# Altium footprint library PassiveComponents.PcbLib: 111 footprints (part 2 of 7)
Each footprint in its own frame and in the unit in brackets; x right, y up, seen from the top. Pads: shape width x height; smd on the part's side, far side on the other; paste and mask are expansions set on the pad; w line width, h text height; cw(c..) or ccw(c..) is an arc to the next point about the centre after c.
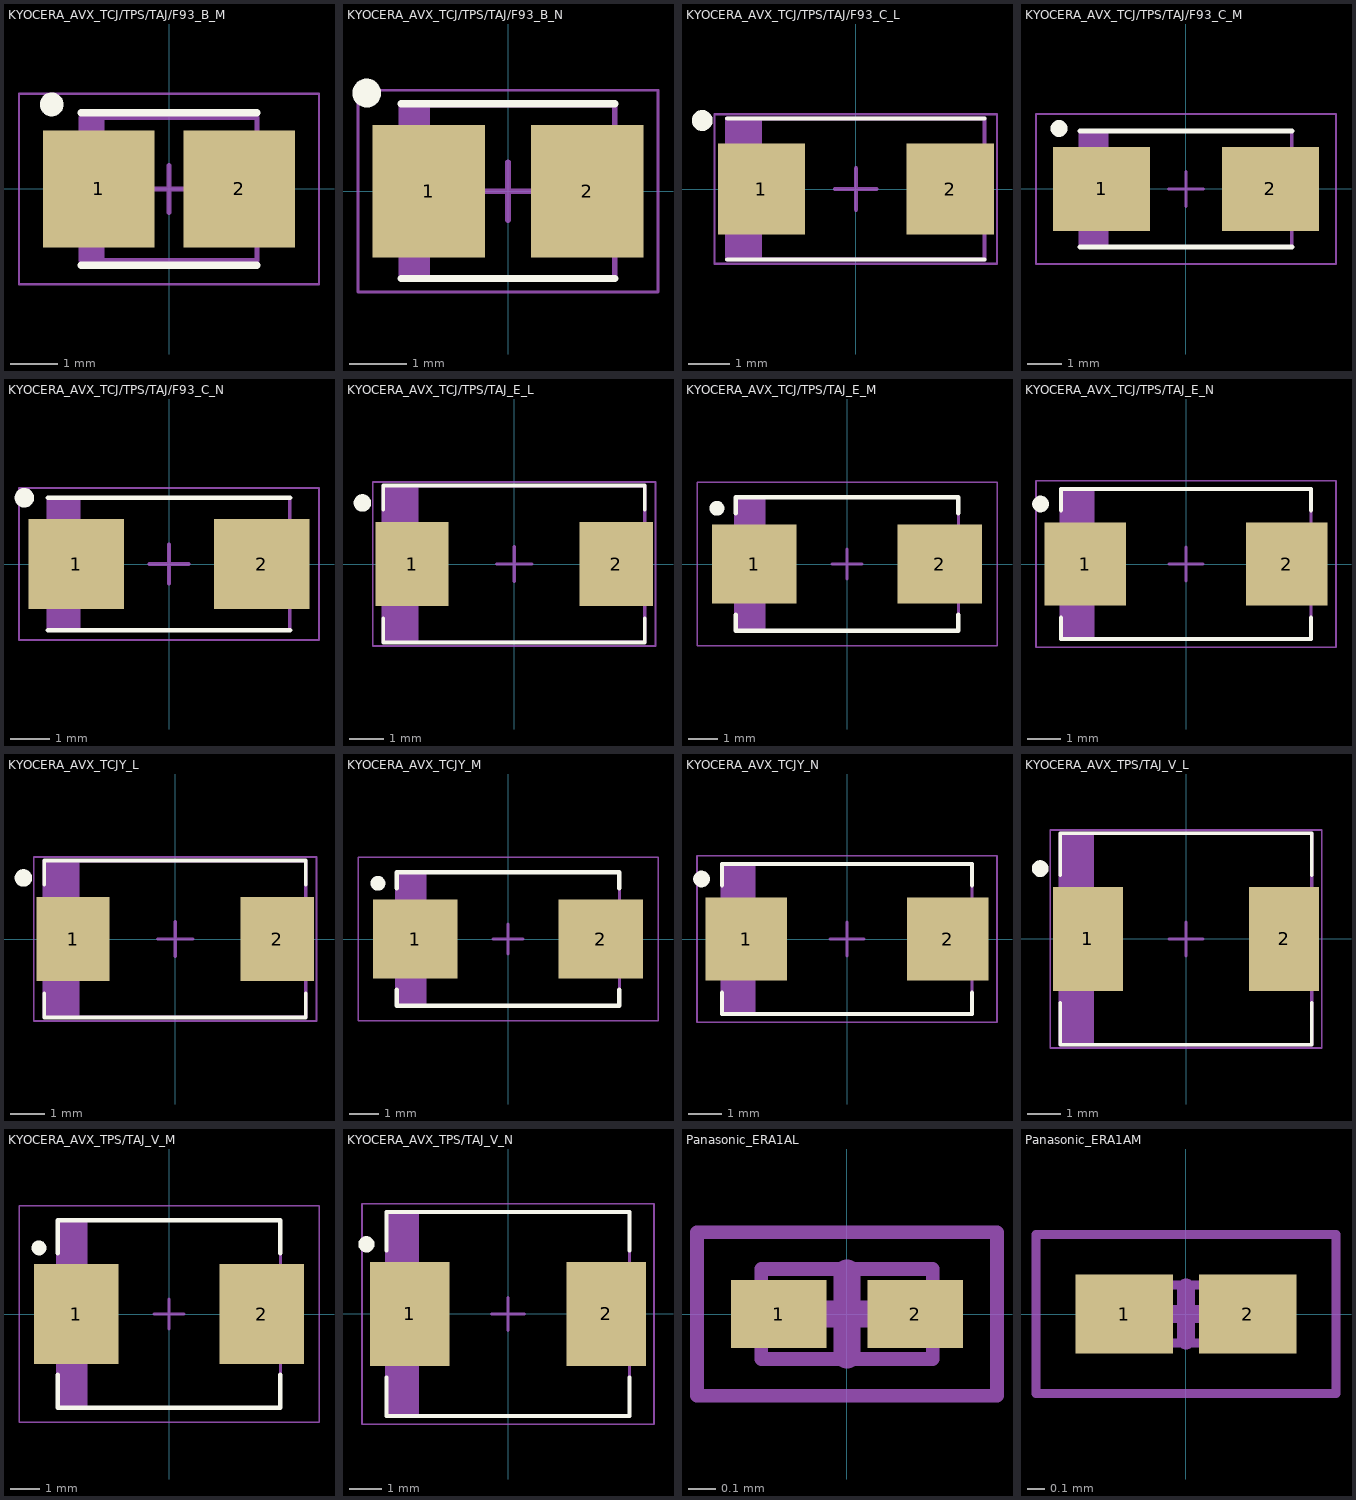
[diagram p1: the footprints below, top view; thin cyan lines are the x and y axes]

## KYOCERA_AVX_TCJ/TPS/TAJ/F93_B_M [mm] "Molded Capacitor, 2-Leads, Body 3.50x2.85mm, IPC Low Density"
height 2.1
pads (2):
  rect 2.35x2.45 smd mask+0.05: 1(-1.475,0) 2(1.475,0)
Top Overlay:
  circle w0.25: c-2.464,1.775 r0.125
  lines w0.152: -1.85,-1.601 1.85,-1.601 ; -1.85,1.601 1.85,1.601
Top Assembly:
  rectangle: -1.85,-1.5 -1.352,1.5
  lines w0.1: -1.85,-1.5 1.85,-1.5 1.85,1.5 -1.85,1.5 -1.85,-1.5
  text "'.Designator'" at -1.209,-0.113 h0.5
Top Courtyard:
  lines w0.05: -3.15,-2 3.15,-2 3.15,2 -3.15,2 -3.15,-2
  lines w0.1: -0.5,0 0.5,0 ; 0,-0.5 0,0.5
3D body "CAPMP3528X21M.step": height 2.1, standoff 0, extent -2.07,-1.5 2.07,1.5

## KYOCERA_AVX_TCJ/TPS/TAJ/F93_B_N [mm] "Molded Capacitor, 2-Leads, Body 3.50x2.85mm, IPC Medium Density"
height 2.1
pads (2):
  rect 1.95x2.3 smd mask+0.05: 1(-1.375,0) 2(1.375,0)
Top Overlay:
  circle w0.25: c-2.449,1.7 r0.125
  lines w0.127: -1.85,-1.514 1.85,-1.514 ; -1.85,1.514 1.85,1.514
Top Assembly:
  rectangle: -1.85,-1.5 -1.352,1.5
  lines w0.1: -1.85,-1.5 1.85,-1.5 1.85,1.5 -1.85,1.5 -1.85,-1.5
  text "'.Designator'" at -1.209,-0.113 h0.5
Top Courtyard:
  lines w0.05: -2.6,-1.75 2.6,-1.75 2.6,1.75 -2.6,1.75 -2.6,-1.75
  lines w0.1: -0.5,0 0.5,0 ; 0,-0.5 0,0.5
3D body "CAPMP3528X21N.step": height 2.1, standoff 0, extent -2.07,-1.5 2.07,1.5

## KYOCERA_AVX_TCJ/TPS/TAJ/F93_C_L [mm] "Molded Capacitor, 2-Leads, Body 6.00x3.25mm, IPC High Density"
height 2.8
pads (2):
  rect 2.1x2.2 smd mask+0.05: 1(-2.275,0) 2(2.275,0)
Top Overlay:
  circle w0.25: c-3.701,1.65 r0.125
  lines w0.102: -3.1,-1.7 3.1,-1.7 ; -3.1,1.7 3.1,1.7
Top Assembly:
  rectangle: -3.1,-1.7 -2.266,1.7
  lines w0.1: -3.1,-1.7 -3.1,1.7 3.1,1.7 3.1,-1.7 -3.1,-1.7
  text "'.Designator'" at -1.209,-0.113 h0.5
Top Courtyard:
  lines w0.05: -3.4,-1.8 -3.4,1.8 3.4,1.8 3.4,-1.8 -3.4,-1.8
  lines w0.1: -0.5,0 0.5,0 ; 0,-0.5 0,0.5
3D body "CAPMP6032X28L.step": height 2.8, standoff 0, extent -3.32,-1.7 3.32,1.7

## KYOCERA_AVX_TCJ/TPS/TAJ/F93_C_M [mm] "Molded Capacitor, 2-Leads, Body 6.00x3.25mm, IPC Low Density"
height 2.8
pads (2):
  rect 2.85x2.45 smd mask+0.05: 1(-2.475,0) 2(2.475,0)
Top Overlay:
  circle w0.25: c-3.724,1.775 r0.125
  lines w0.152: -3.1,-1.7 3.1,-1.7 ; -3.1,1.7 3.1,1.7
Top Assembly:
  rectangle: -3.1,-1.7 -2.266,1.7
  lines w0.1: -3.1,-1.7 3.1,-1.7 3.1,1.7 -3.1,1.7 -3.1,-1.7
  text "'.Designator'" at -1.209,-0.113 h0.5
Top Courtyard:
  lines w0.05: -4.4,-2.2 4.4,-2.2 4.4,2.2 -4.4,2.2 -4.4,-2.2
  lines w0.1: -0.5,0 0.5,0 ; 0,-0.5 0,0.5
3D body "CAPMP6032X28M.step": height 2.8, standoff 0, extent -3.32,-1.7 3.32,1.7

## KYOCERA_AVX_TCJ/TPS/TAJ/F93_C_N [mm] "Molded Capacitor, 2-Leads, Body 6.00x3.25mm, IPC Medium Density"
height 2.8
pads (2):
  rect 2.45x2.3 smd mask+0.05: 1(-2.375,0) 2(2.375,0)
Top Overlay:
  circle w0.25: c-3.713,1.7 r0.125
  lines w0.127: -3.1,-1.7 3.1,-1.7 ; -3.1,1.7 3.1,1.7
Top Assembly:
  rectangle: -3.1,-1.7 -2.266,1.7
  lines w0.1: -3.1,-1.7 3.1,-1.7 3.1,1.7 -3.1,1.7 -3.1,-1.7
  text "'.Designator'" at -1.209,-0.113 h0.5
Top Courtyard:
  lines w0.05: -3.85,-1.95 3.85,-1.95 3.85,1.95 -3.85,1.95 -3.85,-1.95
  lines w0.1: -0.5,0 0.5,0 ; 0,-0.5 0,0.5
3D body "CAPMP6032X28N.step": height 2.8, standoff 0, extent -3.32,-1.7 3.32,1.7

## KYOCERA_AVX_TCJ/TPS/TAJ_E_L [mm] "Molded Capacitor, 2-Leads, Body 7.30x4.35mm, IPC High Density"
height 4.3
pads (2):
  rect 2.1x2.4 smd mask+0.05: 1(-2.925,0) 2(2.925,0)
Top Overlay:
  circle w0.25: c-4.351,1.75 r0.125
  lines w0.102: -3.75,-1.551 -3.75,-2.25 3.75,-2.25 3.75,-1.551 ; -3.75,1.551 -3.75,2.25 3.75,2.25 3.75,1.551
Top Assembly:
  rectangle: -3.75,-2.25 -2.741,2.25
  lines w0.1: -3.75,-2.25 -3.75,2.25 3.75,2.25 3.75,-2.25 -3.75,-2.25
  text "'.Designator'" at -1.209,-0.113 h0.5
Top Courtyard:
  lines w0.05: -4.05,-2.35 -4.05,2.35 4.05,2.35 4.05,-2.35 -4.05,-2.35
  lines w0.1: -0.5,0 0.5,0 ; 0,-0.5 0,0.5
3D body "CAPMP7344X43L.step": height 4.3, standoff 0, extent -3.97,-2.25 3.97,2.25

## KYOCERA_AVX_TCJ/TPS/TAJ_E_M [mm] "Molded Capacitor, 2-Leads, Body 7.30x4.35mm, IPC Low Density"
height 4.3
pads (2):
  rect 2.85x2.65 smd mask+0.05: 1(-3.125,0) 2(3.125,0)
Top Overlay:
  circle w0.25: c-4.376,1.875 r0.125
  lines w0.152: -3.75,-1.701 -3.75,-2.25 3.75,-2.25 3.75,-1.701 ; -3.75,1.701 -3.75,2.25 3.75,2.25 3.75,1.701
Top Assembly:
  rectangle: -3.75,-2.25 -2.741,2.25
  lines w0.1: -3.75,-2.25 3.75,-2.25 3.75,2.25 -3.75,2.25 -3.75,-2.25
  text "'.Designator'" at -1.209,-0.113 h0.5
Top Courtyard:
  lines w0.05: -5.05,-2.75 5.05,-2.75 5.05,2.75 -5.05,2.75 -5.05,-2.75
  lines w0.1: -0.5,0 0.5,0 ; 0,-0.5 0,0.5
3D body "CAPMP7344X43M.step": height 4.3, standoff 0, extent -3.97,-2.25 3.97,2.25

## KYOCERA_AVX_TCJ/TPS/TAJ_E_N [mm] "Molded Capacitor, 2-Leads, Body 7.30x4.35mm, IPC Medium Density"
height 4.3
pads (2):
  rect 2.45x2.5 smd mask+0.05: 1(-3.025,0) 2(3.025,0)
Top Overlay:
  circle w0.25: c-4.363,1.8 r0.125
  lines w0.127: -3.75,-1.614 -3.75,-2.25 3.75,-2.25 3.75,-1.614 ; -3.75,1.614 -3.75,2.25 3.75,2.25 3.75,1.614
Top Assembly:
  rectangle: -3.75,-2.25 -2.741,2.25
  lines w0.1: -3.75,-2.25 3.75,-2.25 3.75,2.25 -3.75,2.25 -3.75,-2.25
  text "'.Designator'" at -1.209,-0.113 h0.5
Top Courtyard:
  lines w0.05: -4.5,-2.5 4.5,-2.5 4.5,2.5 -4.5,2.5 -4.5,-2.5
  lines w0.1: -0.5,0 0.5,0 ; 0,-0.5 0,0.5
3D body "CAPMP7344X43N.step": height 4.3, standoff 0, extent -3.97,-2.25 3.97,2.25

## KYOCERA_AVX_TCJY_L [mm] "Molded Capacitor, 2-Leads, Body 7.30x4.35mm, IPC High Density"
height 2.2
pads (2):
  rect 2.1x2.4 smd mask+0.05: 1(-2.925,0) 2(2.925,0)
Top Overlay:
  circle w0.25: c-4.351,1.75 r0.125
  lines w0.102: -3.75,-1.551 -3.75,-2.25 3.75,-2.25 3.75,-1.551 ; -3.75,1.551 -3.75,2.25 3.75,2.25 3.75,1.551
Top Assembly:
  rectangle: -3.75,-2.25 -2.741,2.25
  lines w0.1: -3.75,-2.25 3.75,-2.25 3.75,2.25 -3.75,2.25 -3.75,-2.25
  text "'.Designator'" at -1.209,-0.113 h0.5
Top Courtyard:
  lines w0.05: -4.05,-2.35 4.05,-2.35 4.05,2.35 -4.05,2.35 -4.05,-2.35
  lines w0.1: -0.5,0 0.5,0 ; 0,-0.5 0,0.5
3D body "CAPMP7344X22L.step": height 2.2, standoff 0, extent -3.97,-2.25 3.97,2.25

## KYOCERA_AVX_TCJY_M [mm] "Molded Capacitor, 2-Leads, Body 7.30x4.35mm, IPC Low Density"
height 2.2
pads (2):
  rect 2.85x2.65 smd mask+0.05: 1(-3.125,0) 2(3.125,0)
Top Overlay:
  circle w0.25: c-4.376,1.875 r0.125
  lines w0.152: -3.75,-1.701 -3.75,-2.25 3.75,-2.25 3.75,-1.701 ; -3.75,1.701 -3.75,2.25 3.75,2.25 3.75,1.701
Top Assembly:
  rectangle: -3.75,-2.25 -2.741,2.25
  lines w0.1: -3.75,-2.25 3.75,-2.25 3.75,2.25 -3.75,2.25 -3.75,-2.25
  text "'.Designator'" at -1.209,-0.113 h0.5
Top Courtyard:
  lines w0.05: -5.05,-2.75 5.05,-2.75 5.05,2.75 -5.05,2.75 -5.05,-2.75
  lines w0.1: -0.5,0 0.5,0 ; 0,-0.5 0,0.5
3D body "CAPMP7344X22M.step": height 2.2, standoff 0, extent -3.97,-2.25 3.97,2.25

## KYOCERA_AVX_TCJY_N [mm] "Molded Capacitor, 2-Leads, Body 7.30x4.35mm, IPC Medium Density"
height 2.2
pads (2):
  rect 2.45x2.5 smd mask+0.05: 1(-3.025,0) 2(3.025,0)
Top Overlay:
  circle w0.25: c-4.363,1.8 r0.125
  lines w0.127: -3.75,-1.614 -3.75,-2.25 3.75,-2.25 3.75,-1.614 ; -3.75,1.614 -3.75,2.25 3.75,2.25 3.75,1.614
Top Assembly:
  rectangle: -3.75,-2.25 -2.741,2.25
  lines w0.1: -3.75,-2.25 -3.75,2.25 3.75,2.25 3.75,-2.25 -3.75,-2.25
  text "'.Designator'" at -1.209,-0.113 h0.5
Top Courtyard:
  lines w0.05: -4.5,-2.5 -4.5,2.5 4.5,2.5 4.5,-2.5 -4.5,-2.5
  lines w0.1: -0.5,0 0.5,0 ; 0,-0.5 0,0.5
3D body "CAPMP7344X22N.step": height 2.2, standoff 0, extent -3.97,-2.25 3.97,2.25

## KYOCERA_AVX_TPS/TAJ_V_L [mm] "Molded Capacitor, 2-Leads, Body 7.30x6.15mm, IPC High Density"
height 3.75
pads (2):
  rect 2.1x3.1 smd mask+0.05: 1(-2.925,0) 2(2.925,0)
Top Overlay:
  circle w0.25: c-4.351,2.1 r0.125
  lines w0.102: -3.75,-1.901 -3.75,-3.15 3.75,-3.15 3.75,-1.901 ; -3.75,1.901 -3.75,3.15 3.75,3.15 3.75,1.901
Top Assembly:
  rectangle: -3.75,-3.15 -2.741,3.15
  lines w0.1: -3.75,-3.15 -3.75,3.15 3.75,3.15 3.75,-3.15 -3.75,-3.15
  text "'.Designator'" at -1.209,-0.113 h0.5
Top Courtyard:
  lines w0.05: -4.05,-3.25 -4.05,3.25 4.05,3.25 4.05,-3.25 -4.05,-3.25
  lines w0.1: -0.5,0 0.5,0 ; 0,-0.5 0,0.5
3D body "CAPMP7362X38L.step": height 3.75, standoff 0, extent -3.97,-3.15 3.97,3.15

## KYOCERA_AVX_TPS/TAJ_V_M [mm] "Molded Capacitor, 2-Leads, Body 7.30x6.15mm, IPC Low Density"
height 3.75
pads (2):
  rect 2.85x3.35 smd mask+0.05: 1(-3.125,0) 2(3.125,0)
Top Overlay:
  circle w0.25: c-4.376,2.225 r0.125
  lines w0.152: -3.75,-2.051 -3.75,-3.15 3.75,-3.15 3.75,-2.051 ; -3.75,2.051 -3.75,3.15 3.75,3.15 3.75,2.051
Top Assembly:
  rectangle: -3.75,-3.15 -2.741,3.15
  lines w0.1: -3.75,-3.15 -3.75,3.15 3.75,3.15 3.75,-3.15 -3.75,-3.15
  text "'.Designator'" at -1.209,-0.113 h0.5
Top Courtyard:
  lines w0.05: -5.05,-3.65 -5.05,3.65 5.05,3.65 5.05,-3.65 -5.05,-3.65
  lines w0.1: -0.5,0 0.5,0 ; 0,-0.5 0,0.5
3D body "CAPMP7362X38M.step": height 3.75, standoff 0, extent -3.97,-3.15 3.97,3.15

## KYOCERA_AVX_TPS/TAJ_V_N [mm] "Molded Capacitor, 2-Leads, Body 7.30x6.15mm, IPC Medium Density"
height 3.75
pads (2):
  rect 2.45x3.2 smd mask+0.05: 1(-3.025,0) 2(3.025,0)
Top Overlay:
  circle w0.25: c-4.364,2.15 r0.125
  lines w0.127: -3.75,-1.963 -3.75,-3.15 3.75,-3.15 3.75,-1.963 ; -3.75,1.963 -3.75,3.15 3.75,3.15 3.75,1.963
Top Assembly:
  rectangle: -3.75,-3.15 -2.741,3.15
  lines w0.1: -3.75,-3.15 3.75,-3.15 3.75,3.15 -3.75,3.15 -3.75,-3.15
  text "'.Designator'" at -1.209,-0.113 h0.5
Top Courtyard:
  lines w0.05: -4.5,-3.4 4.5,-3.4 4.5,3.4 -4.5,3.4 -4.5,-3.4
  lines w0.1: -0.5,0 0.5,0 ; 0,-0.5 0,0.5
3D body "CAPMP7362X38N.step": height 3.75, standoff 0, extent -3.97,-3.15 3.97,3.15

## Panasonic_ERA1AL [mm] "Chip Resistor, 2-Leads, Body 0.60x0.30mm, IPC High Density"
height 0.26
pads (2):
  rect 0.35x0.25 smd mask+0.03: 1(-0.25,0) 2(0.25,0)
Top Assembly:
  lines w0.05: -0.315,-0.165 0.315,-0.165 0.315,0.165 -0.315,0.165 -0.315,-0.165
  text "'.Designator'" at -0.242,-0.023 h0.1
Top Courtyard:
  lines w0.05: -0.55,-0.3 0.55,-0.3 0.55,0.3 -0.55,0.3 -0.55,-0.3
  lines w0.1: -0.15,0 0.15,0 ; 0,-0.15 0,0.15
3D body "RESC0603X03L.step": height 0.26, standoff 0, extent -0.315,-0.165 0.315,0.165

## Panasonic_ERA1AM [mm] "Chip Resistor, 2-Leads, Body 0.60x0.30mm, IPC Low Density"
height 0.26
pads (2):
  rect 0.55x0.45 smd mask+0.03: 1(-0.35,0) 2(0.35,0)
Top Assembly:
  lines w0.05: -0.315,-0.165 -0.315,0.165 0.315,0.165 0.315,-0.165 -0.315,-0.165
  text "'.Designator'" at -0.242,-0.023 h0.1
Top Courtyard:
  lines w0.05: -0.85,-0.45 -0.85,0.45 0.85,0.45 0.85,-0.45 -0.85,-0.45
  lines w0.1: -0.15,0 0.15,0 ; 0,-0.15 0,0.15
3D body "RESC0603X03M.step": height 0.26, standoff 0, extent -0.315,-0.165 0.315,0.165